# Altium footprint library ST封装.PcbLib: 1336 footprints (part 58 of 109)
Each footprint in its own frame and in the unit in brackets; x right, y up, seen from the top. Pads: shape width x height; smd on the part's side, far side on the other; paste and mask are expansions set on the pad; w line width, h text height; cw(c..) or ccw(c..) is an arc to the next point about the centre after c.
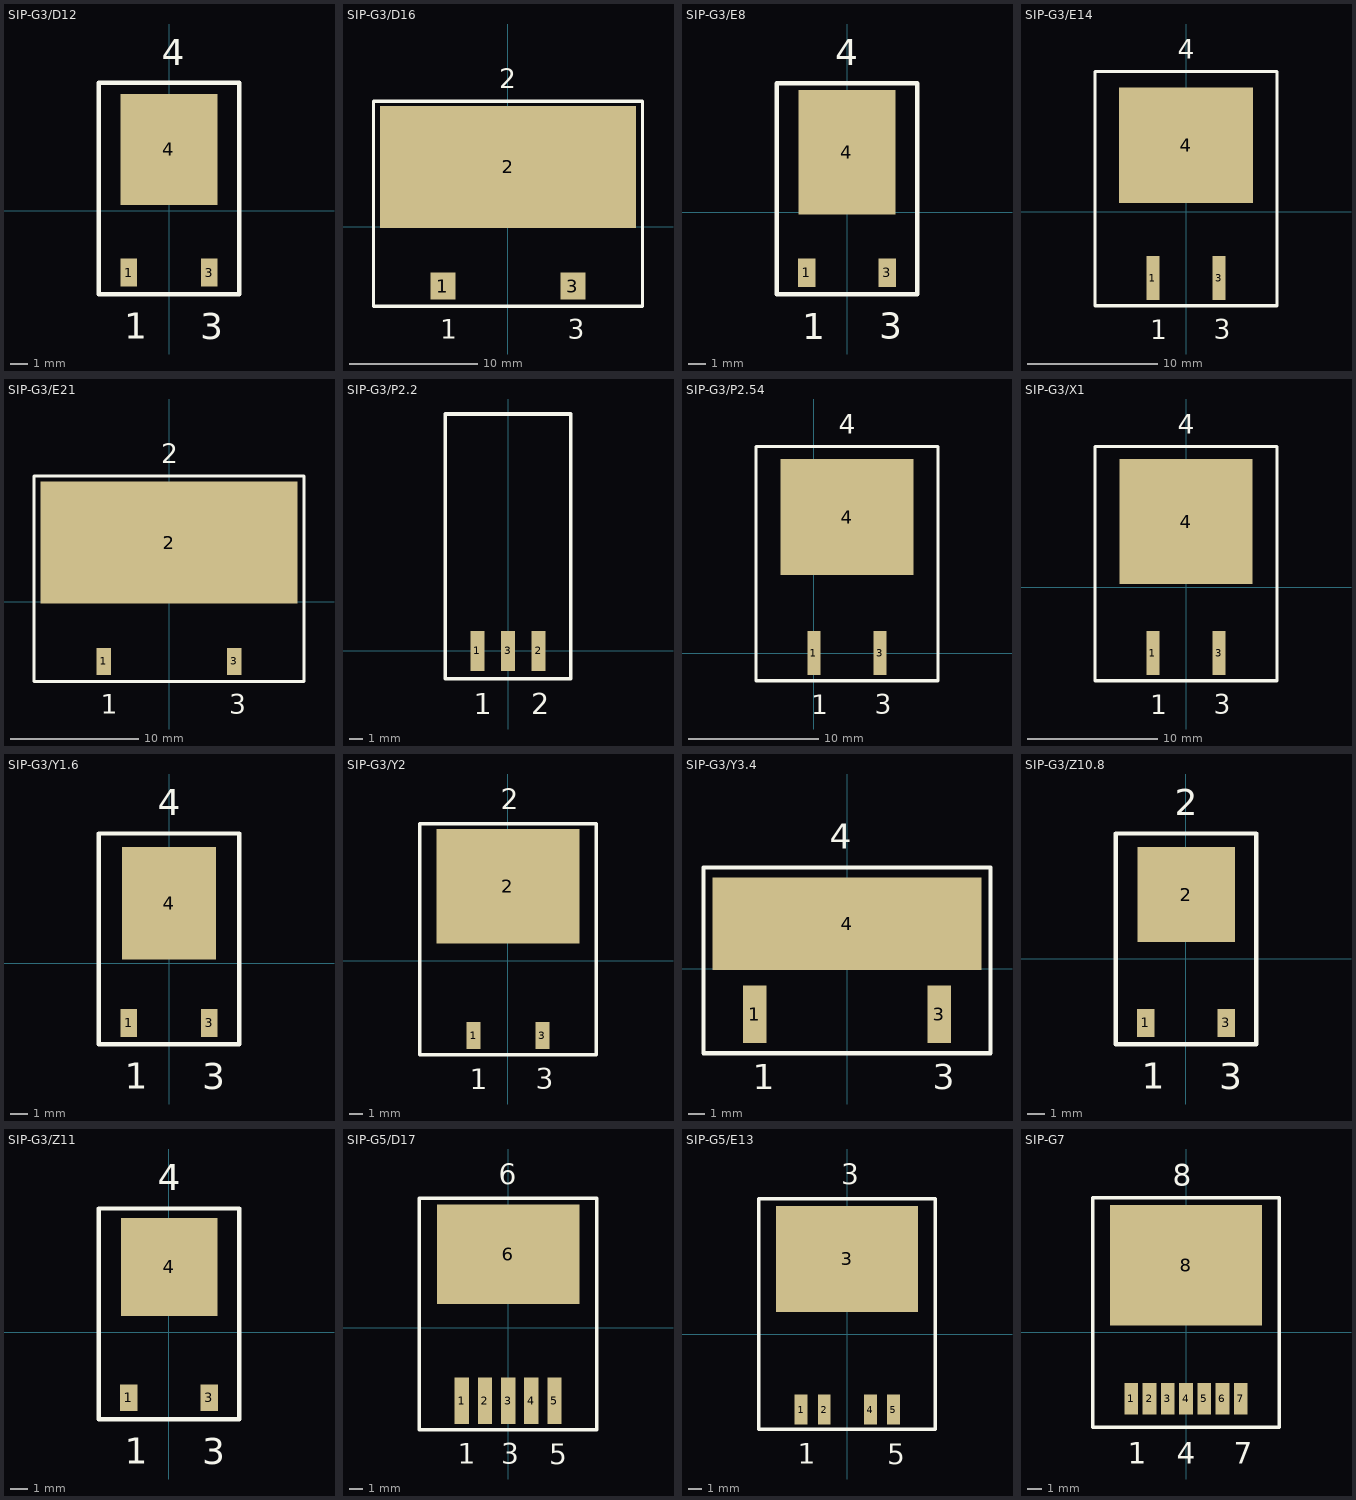
[diagram p57: the footprints below, top view; thin cyan lines are the x and y axes]

## SIP-G3/D12 [mm]
pads (3):
  rect 0.95x1.6 smd: 1(-2.285,-3.5) 3(2.285,-3.5)
  rect 5.5x6.3 smd: 4(-0.005,3.5)
Top Overlay:
  lines w0.254: -4,-4.72 4,-4.72 4,7.28 -4,7.28 -4,-4.72
  text "3" at 1.784,-7.27 h1.5
  text "1" at -2.539,-7.245 h1.5
  text "4" at -0.412,8.269 h1.5

## SIP-G3/D16 [mm]
pads (3):
  rect 1.95x2.1 smd: 1(-5.075,-4.65) 3(5.075,-4.65)
  rect 19.95x9.5 smd: 2(0.005,4.65)
Top Overlay:
  lines w0.25: -10.495,-6.225 -10.495,9.775 10.505,9.775 10.505,-6.225 -10.495,-6.225
  text "3" at 4.658,-8.774 h1.5
  text "1" at -5.276,-8.775 h1.5
  text "2" at -0.677,10.786 h1.5

## SIP-G3/E8 [mm]
pads (3):
  rect 1x1.6 smd: 1(-2.285,-3.425) 3(2.285,-3.425)
  rect 5.5x7.1 smd: 4(-0.005,3.425)
Top Overlay:
  lines w0.254: -4,-4.645 -4,7.355 4,7.355 4,-4.645 -4,-4.645
  text "4" at -0.666,8.367 h1.5
  text "1" at -2.539,-7.195 h1.5
  text "3" at 1.831,-7.194 h1.5

## SIP-G3/E14 [mm]
pads (3):
  rect 1x3.4 smd: 1(-2.54,-5.1) 3(2.54,-5.1)
  rect 10.3x8.9 smd: 4(0,5.1)
Top Overlay:
  lines w0.254: -7,-7.22 7,-7.22 7,10.78 -7,10.78 -7,-7.22
  text "4" at -0.615,11.773 h1.5
  text "1" at -2.75,-9.787 h1.5
  text "3" at 2.123,-9.771 h1.5

## SIP-G3/E21 [mm]
pads (3):
  rect 1.1x2.1 smd: 1(-5.08,-4.625) 3(5.08,-4.625)
  rect 20x9.5 smd: 2(0,4.625)
Top Overlay:
  lines w0.25: -10.5,-6.2 10.5,-6.2 10.5,9.8 -10.5,9.8 -10.5,-6.2
  text "3" at 4.684,-8.719 h1.5
  text "1" at -5.312,-8.689 h1.5
  text "2" at -0.59,10.811 h1.5

## SIP-G3/P2.2 [mm]
pads (3):
  rect 1x2.9 smd: 1(-2.2,0) 2(2.2,0) 3(0,0)
Top Overlay:
  lines w0.254: -4.5,-2 4.5,-2 4.5,17 -4.5,17 -4.5,-2
  text "1" at -2.456,-4.519 h1.5
  text "2" at 1.65,-4.519 h1.5

## SIP-G3/P2.54 [mm]
pads (3):
  rect 1x3.4 smd: 1(0,0) 3(5.08,0)
  rect 10.25x8.9 smd: 4(2.54,10.45)
Top Overlay:
  lines w0.254: -4.46,-2.12 -4.46,15.88 9.54,15.88 9.54,-2.12 -4.46,-2.12
  text "3" at 4.663,-4.671 h1.5
  text "1" at -0.21,-4.687 h1.5
  text "4" at 1.925,16.873 h1.5

## SIP-G3/X1 [mm]
pads (3):
  rect 1x3.4 smd: 1(-2.54,-5.05) 3(2.54,-5.05)
  rect 10.25x9.6 smd: 4(0,5.05)
Top Overlay:
  lines w0.254: -7,-7.17 -7,10.83 7,10.83 7,-7.17 -7,-7.17
  text "3" at 2.123,-9.721 h1.5
  text "1" at -2.75,-9.737 h1.5
  text "4" at -0.615,11.823 h1.5

## SIP-G3/Y1.6 [mm]
pads (3):
  rect 0.95x1.6 smd: 1(-2.285,-3.4) 3(2.285,-3.4)
  rect 5.35x6.4 smd: 4(0.005,3.4)
Top Overlay:
  lines w0.254: -4,-4.62 4,-4.62 4,7.38 -4,7.38 -4,-4.62
  text "3" at 1.9,-7.169 h1.5
  text "1" at -2.516,-7.145 h1.5
  text "4" at -0.643,8.415 h1.5

## SIP-G3/Y2 [mm]
pads (3):
  rect 1.05x2 smd: 1(-2.54,-5.5) 3(2.54,-5.5)
  rect 10.55x8.4 smd: 2(0,5.5)
Top Overlay:
  lines w0.254: -6.5,-6.9 6.5,-6.9 6.5,10.1 -6.5,10.1 -6.5,-6.9
  text "2" at -0.546,11.16 h1.5
  text "1" at -2.808,-9.431 h1.5
  text "3" at 2.042,-9.43 h1.5

## SIP-G3/Y3.4 [mm]
pads (3):
  rect 1.4x3.4 smd: 1(-5.46,-2.675) 3(5.46,-2.675)
  rect 15.95x5.5 smd: 4(0,2.675)
Top Overlay:
  lines w0.25: -8.5,-5 8.5,-5 8.5,6 -8.5,6 -8.5,-5
  text "4" at -1.016,7.112 h1.5
  text "1" at -5.588,-7.112 h1.5
  text "3" at 5.08,-7.112 h1.5

## SIP-G3/Z10.8 [mm]
pads (3):
  rect 1x1.6 smd: 1(-2.285,-3.65) 3(2.285,-3.65)
  rect 5.55x5.4 smd: 2(0.005,3.65)
Top Overlay:
  lines w0.254: -4,-4.87 -4,7.13 4,7.13 4,-4.87 -4,-4.87
  text "2" at -0.643,8.165 h1.5
  text "1" at -2.516,-7.395 h1.5
  text "3" at 1.9,-7.419 h1.5

## SIP-G3/Z11 [mm]
pads (3):
  rect 1x1.5 smd: 1(-2.285,-3.725) 3(2.285,-3.725)
  rect 5.5x5.6 smd: 4(0.005,3.725)
Top Overlay:
  lines w0.254: -4,-4.945 -4,7.055 4,7.055 4,-4.945 -4,-4.945
  text "4" at -0.643,8.09 h1.5
  text "1" at -2.516,-7.47 h1.5
  text "3" at 1.9,-7.494 h1.5

## SIP-G5/D17 [mm]
pads (6):
  rect 1.05x3.4 smd: 1(-3.4,-5.375) 2(-1.7,-5.375) 3(0,-5.375) 4(1.7,-5.375) 5(3.4,-5.375)
  rect 10.45x7.3 smd: 6(0,5.375)
Top Overlay:
  lines w0.254: -6.51,-7.5 -6.51,9.5 6.49,9.5 6.49,-7.5 -6.51,-7.5
  text "1" at -3.701,-9.974 h1.5
  text "3" at -0.497,-9.985 h1.5
  text "5" at 3.006,-10.006 h1.5
  text "6" at -0.673,10.504 h1.5

## SIP-G5/E13 [mm]
pads (5):
  rect 0.95x2.2 smd: 1(-3.4,-5.55) 2(-1.7,-5.55) 4(1.7,-5.55) 5(3.4,-5.55)
  rect 10.45x7.8 smd: 3(-0.01,5.55)
Top Overlay:
  lines w0.254: -6.52,-7 -6.52,10 6.48,10 6.48,-7 -6.52,-7
  text "5" at 2.94,-9.563 h1.5
  text "1" at -3.636,-9.529 h1.5
  text "3" at -0.445,11.046 h1.5

## SIP-G7 [mm]
pads (8):
  rect 0.95x2.2 smd: 1(-3.81,-4.65) 2(-2.54,-4.65) 3(-1.27,-4.65) 4(0,-4.65) 5(1.27,-4.65) 6(2.54,-4.65) 7(3.81,-4.65)
  rect 10.6x8.4 smd: 8(0,4.65)
Top Overlay:
  lines w0.254: -6.5,-6.65 6.5,-6.65 6.5,9.35 -6.5,9.35 -6.5,-6.65
  text "8" at -0.907,10.213 h1.5
  text "1" at -4.066,-9.169 h1.5
  text "7" at 3.325,-9.2 h1.5
  text "4" at -0.631,-9.184 h1.5